# Altium schematic symbol library Diodes - TVS.SchLib: 5379 symbols (part 10 of 35) (continued)
## PESD5V0S1BB,335 (continued)
TVS DIODE 5V 14V SOD523; Manufacturer: Nexperia USA Inc.; Bidirectional Channels: 1; Capacitance @ Frequency: 35pF @ 1MHz; Current - Peak Pulse (10/1000µs): 12A (8/20µs); Power Line Protection: No; Power - Peak Pulse: 130W; Type: Zener; Voltage - Breakdown (Min): 5.5V; Voltage - Reverse Standoff (Typ): 5V (Max); Part Number: PESD5V0S1BB,335; Applications: General Purpose; ComponentLink1Description: Datasheet; ComponentLink1URL: https://assets.nexperia.com/documents/data-sheet/PESD5V0S1BA_BB_BL.pdf; ComponentLink2Description: DigiKey Link; ComponentLink2URL: http://digikey.com/product-detail/en/nexperia-usa-inc/PESD5V0S1BB335/1727-5799-1-ND/2698191; LastUpdated: 9/2/2020 1:28:25 AM; Lifecycle Status: Active; Minimum Order: 1; Mounting Type: Surface Mount; Operating Temperature: -65°C ~ 150°C (TA); Package / Case: SC-79, SOD-523; Packaging: TapeAndReel; PartId: 9821; Part Status: Active; Price: 0.05; Series: -; Supplier 1: DigiKey; Supplier Part Number 1: 1727-5799-1-ND; Supplier Device Package: SOD-523; Voltage - Clamping (Max) @ Ipp: 14V
footprint SOD523F
pins: 1, 2

## PESD5V0S1UA,115
designator D?
TVS DIODE 5V 19V SOD323; Manufacturer: Nexperia USA Inc.; Capacitance @ Frequency: 480pF @ 1MHz; Current - Peak Pulse (10/1000µs): 47A (8/20µs); Power Line Protection: No; Power - Peak Pulse: 890W; Type: Zener; Unidirectional Channels: 1; Voltage - Breakdown (Min): 6.2V; Voltage - Reverse Standoff (Typ): 5V (Max); Part Number: PESD5V0S1UA,115; Applications: Automotive; ComponentLink1Description: Datasheet; ComponentLink1URL: https://assets.nexperia.com/documents/data-sheet/PESD5V0S1UA_PESD12VS1UA.pdf; ComponentLink2Description: DigiKey Link; ComponentLink2URL: http://digikey.com/product-detail/en/nexperia-usa-inc/PESD5V0S1UA115/1727-5801-1-ND/2697465; LastUpdated: 9/2/2020 1:28:27 AM; Lifecycle Status: Active; Minimum Order: 1; Mounting Type: Surface Mount; Operating Temperature: -55°C ~ 150°C (TA); Package / Case: SC-76, SOD-323; Packaging: TapeAndReel; PartId: 9878; Part Status: Active; Price: 0.08; Series: Automotive, AEC-Q101; Supplier 1: DigiKey; Supplier Part Number 1: 1727-5801-1-ND; Supplier Device Package: SOD-323; Voltage - Clamping (Max) @ Ipp: 19V
footprint SOD323
pins: 1, 2

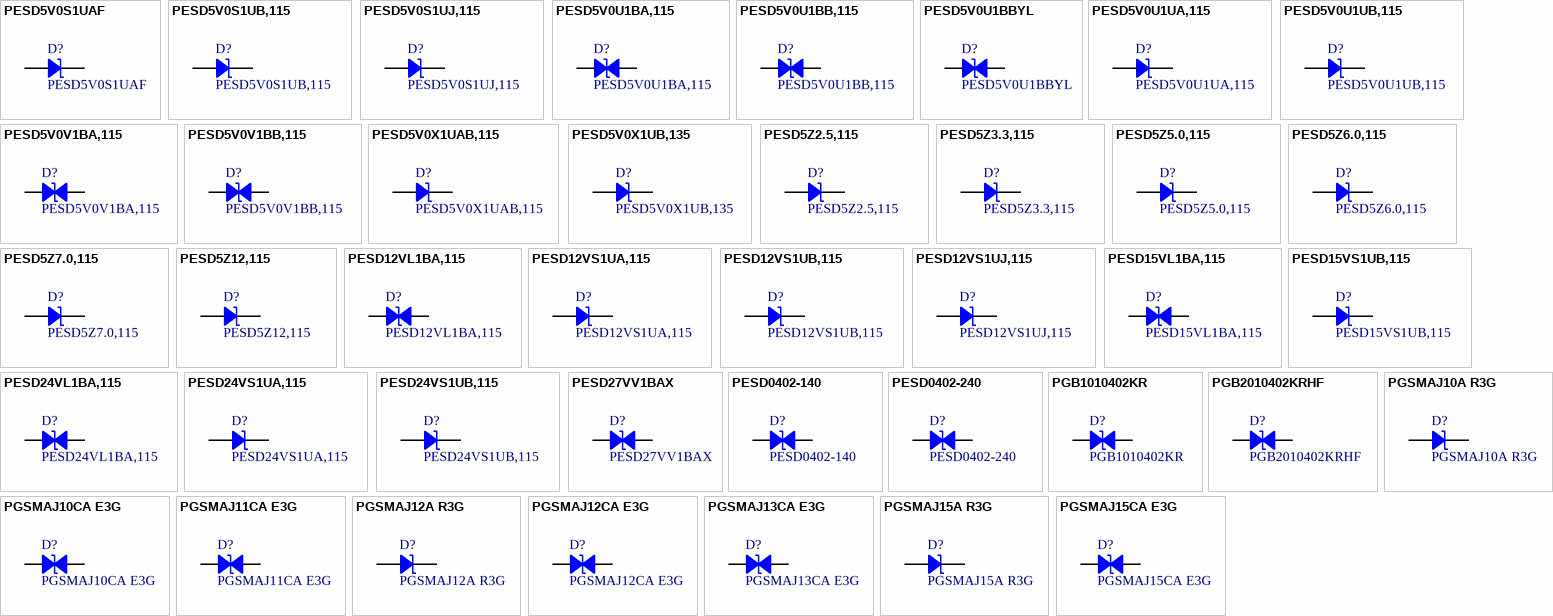
[diagram p35: symbols PESD5V0S1UAF to PGSMAJ15CA E3G]

## PESD5V0S1UAF
designator D?
TVS DIODE 5V 19V SOD323; Manufacturer: Nexperia USA Inc.; Capacitance @ Frequency: 480pF @ 1MHz; Current - Peak Pulse (10/1000µs): 47A (8/20µs); Power Line Protection: No; Power - Peak Pulse: 890W; Type: Zener; Unidirectional Channels: 1; Voltage - Breakdown (Min): 6.2V; Voltage - Reverse Standoff (Typ): 5V (Max); Part Number: PESD5V0S1UAF; Applications: Automotive; ComponentLink1Description: Datasheet; ComponentLink1URL: https://assets.nexperia.com/documents/data-sheet/PESD5V0S1UA_PESD12VS1UA.pdf; ComponentLink2Description: DigiKey Link; ComponentLink2URL: http://digikey.com/product-detail/en/nexperia-usa-inc/PESD5V0S1UAF/1727-2750-1-ND/6576215; LastUpdated: 9/2/2020 1:28:27 AM; Lifecycle Status: Active; Minimum Order: 1; Mounting Type: Surface Mount; Operating Temperature: -55°C ~ 150°C (TA); Package / Case: SC-76, SOD-323; Packaging: TapeAndReel; PartId: 9871; Part Status: Active; Price: 0.06; Series: Automotive, AEC-Q101; Supplier 1: DigiKey; Supplier Part Number 1: 1727-2750-1-ND; Supplier Device Package: SOD-323; Voltage - Clamping (Max) @ Ipp: 19V
footprint SOD323
pins: 1, 2

## PESD5V0S1UB,115
designator D?
TVS DIODE 5V 20V SOD523; Manufacturer: Nexperia USA Inc.; Capacitance @ Frequency: 152pF @ 1MHz; Current - Peak Pulse (10/1000µs): 15A (8/20µs); Power Line Protection: No; Power - Peak Pulse: 260W; Type: Zener; Unidirectional Channels: 1; Voltage - Breakdown (Min): 6.4V; Voltage - Reverse Standoff (Typ): 5V (Max); Part Number: PESD5V0S1UB,115; Applications: General Purpose; ComponentLink1Description: Datasheet; ComponentLink1URL: https://assets.nexperia.com/documents/data-sheet/PESDXS1UB_SERIES.pdf; ComponentLink2Description: DigiKey Link; ComponentLink2URL: http://digikey.com/product-detail/en/nexperia-usa-inc/PESD5V0S1UB115/1727-3839-1-ND/1530845; LastUpdated: 9/2/2020 1:28:24 AM; Lifecycle Status: Active; Minimum Order: 1; Mounting Type: Surface Mount; Operating Temperature: -65°C ~ 150°C (TA); Package / Case: SC-79, SOD-523; Packaging: TapeAndReel; PartId: 9746; Part Status: Active; Price: 0.09; Series: -; Supplier 1: DigiKey; Supplier Part Number 1: 1727-3839-1-ND; Supplier Device Package: SOD-523; Voltage - Clamping (Max) @ Ipp: 20V
footprint SOD523F
pins: 1, 2

## PESD5V0S1UJ,115
designator D?
TVS DIODE 5V 19V SOD323F; Manufacturer: Nexperia USA Inc.; Capacitance @ Frequency: 480pF @ 1MHz; Current - Peak Pulse (10/1000µs): 47A (8/20µs); Power Line Protection: No; Power - Peak Pulse: 890W; Type: Zener; Unidirectional Channels: 1; Voltage - Breakdown (Min): 6.2V; Voltage - Reverse Standoff (Typ): 5V (Max); Part Number: PESD5V0S1UJ,115; Applications: Automotive; ComponentLink1Description: Datasheet; ComponentLink1URL: https://assets.nexperia.com/documents/data-sheet/PESD5V0S1UJ_PESD12VS1UJ.pdf; ComponentLink2Description: DigiKey Link; ComponentLink2URL: http://digikey.com/product-detail/en/nexperia-usa-inc/PESD5V0S1UJ115/1727-5802-1-ND/2697512; LastUpdated: 9/2/2020 1:28:42 AM; Lifecycle Status: Active; Minimum Order: 1; Mounting Type: Surface Mount; Operating Temperature: -55°C ~ 150°C (TA); Package / Case: SC-90, SOD-323F; Packaging: TapeAndReel; PartId: 10357; Part Status: Active; Price: 0.08; Series: Automotive, AEC-Q101; Supplier 1: DigiKey; Supplier Part Number 1: 1727-5802-1-ND; Supplier Device Package: SOD-323F; Voltage - Clamping (Max) @ Ipp: 19V
footprint SOD323F
pins: 1, 2

## PESD5V0U1BA,115
designator D?
TVS DIODE 5V SOD323; Manufacturer: Nexperia USA Inc.; Bidirectional Channels: 1; Capacitance @ Frequency: 2.9pF @ 1MHz; Power Line Protection: No; Type: Zener; Voltage - Breakdown (Min): 5.5V; Voltage - Reverse Standoff (Typ): 5V (Max); Part Number: PESD5V0U1BA,115; Applications: General Purpose; ComponentLink1Description: Datasheet; ComponentLink1URL: https://assets.nexperia.com/documents/data-sheet/PESD5V0U1BA_BB_BL.pdf; ComponentLink2Description: DigiKey Link; ComponentLink2URL: http://digikey.com/product-detail/en/nexperia-usa-inc/PESD5V0U1BA115/1727-3934-1-ND/1692988; LastUpdated: 9/2/2020 1:28:29 AM; Lifecycle Status: Active; Minimum Order: 1; Mounting Type: Surface Mount; Operating Temperature: -65°C ~ 150°C (TA); Package / Case: SC-76, SOD-323; Packaging: TapeAndReel; PartId: 9937; Part Status: Active; Price: 0.09; Series: -; Supplier 1: DigiKey; Supplier Part Number 1: 1727-3934-1-ND; Supplier Device Package: SOD-323
footprint SOD323
pins: 1, 2

## PESD5V0U1BB,115
designator D?
TVS DIODE 5V SOD523; Manufacturer: Nexperia USA Inc.; Bidirectional Channels: 1; Capacitance @ Frequency: 2.9pF @ 1MHz; Power Line Protection: No; Type: Zener; Voltage - Breakdown (Min): 5.5V; Voltage - Reverse Standoff (Typ): 5V (Max); Part Number: PESD5V0U1BB,115; Applications: General Purpose; ComponentLink1Description: Datasheet; ComponentLink1URL: https://assets.nexperia.com/documents/data-sheet/PESD5V0U1BA_BB_BL.pdf; ComponentLink2Description: DigiKey Link; ComponentLink2URL: http://digikey.com/product-detail/en/nexperia-usa-inc/PESD5V0U1BB115/1727-3935-1-ND/1692989; LastUpdated: 9/2/2020 1:28:25 AM; Lifecycle Status: Active; Minimum Order: 1; Mounting Type: Surface Mount; Operating Temperature: -65°C ~ 150°C (TA); Package / Case: SC-79, SOD-523; Packaging: TapeAndReel; PartId: 9829; Part Status: Active; Price: 0.15; Series: -; Supplier 1: DigiKey; Supplier Part Number 1: 1727-3935-1-ND; Supplier Device Package: SOD-523
footprint SOD523F
pins: 1, 2

## PESD5V0U1BBYL
designator D?
TVS DIODE 5V SOD523; Manufacturer: Nexperia USA Inc.; Bidirectional Channels: 1; Capacitance @ Frequency: 2.9pF @ 1MHz; Power Line Protection: No; Type: Zener; Voltage - Breakdown (Min): 5.5V; Voltage - Reverse Standoff (Typ): 5V (Max); Part Number: PESD5V0U1BBYL; Applications: General Purpose; ComponentLink1Description: Datasheet; ComponentLink1URL: https://assets.nexperia.com/documents/data-sheet/PESD5V0U1BA_BB_BL.pdf; ComponentLink2Description: DigiKey Link; ComponentLink2URL: http://digikey.com/product-detail/en/nexperia-usa-inc/PESD5V0U1BBYL/1727-8532-1-ND/10061269; LastUpdated: 9/2/2020 1:28:25 AM; Lifecycle Status: Active; Minimum Order: 1; Mounting Type: Surface Mount; Operating Temperature: 150°C (TJ); Package / Case: SC-79, SOD-523; Packaging: TapeAndReel; PartId: 9817; Part Status: Active; Price: 0.08; Series: -; Supplier 1: DigiKey; Supplier Part Number 1: 1727-8532-1-ND; Supplier Device Package: SOD-523
footprint SOD523F
pins: 1, 2

## PESD5V0U1UA,115
designator D?
TVS DIODE 5V SOD323; Manufacturer: Nexperia USA Inc.; Capacitance @ Frequency: 2pF @ 1MHz; Power Line Protection: No; Type: Zener; Unidirectional Channels: 1; Voltage - Breakdown (Min): 5.8V; Voltage - Reverse Standoff (Typ): 5V (Max); Part Number: PESD5V0U1UA,115; Applications: Automotive; ComponentLink1Description: Datasheet; ComponentLink1URL: https://assets.nexperia.com/documents/data-sheet/PESD5V0U1UA_UB_UL.pdf; ComponentLink2Description: DigiKey Link; ComponentLink2URL: http://digikey.com/product-detail/en/nexperia-usa-inc/PESD5V0U1UA115/1727-4155-1-ND/1993007; LastUpdated: 9/2/2020 1:28:27 AM; Lifecycle Status: Active; Minimum Order: 1; Mounting Type: Surface Mount; Operating Temperature: -55°C ~ 150°C (TA); Package / Case: SC-76, SOD-323; Packaging: TapeAndReel; PartId: 9900; Part Status: Active; Price: 0.08; Series: Automotive, AEC-Q101; Supplier 1: DigiKey; Supplier Part Number 1: 1727-4155-1-ND; Supplier Device Package: SOD-323
footprint SOD323
pins: 1, 2

## PESD5V0U1UB,115
designator D?
TVS DIODE 5V SOD523; Manufacturer: Nexperia USA Inc.; Capacitance @ Frequency: 2pF @ 1MHz; Power Line Protection: No; Type: Zener; Unidirectional Channels: 1; Voltage - Breakdown (Min): 5.8V; Voltage - Reverse Standoff (Typ): 5V (Max); Part Number: PESD5V0U1UB,115; Applications: Automotive; ComponentLink1Description: Datasheet; ComponentLink1URL: https://assets.nexperia.com/documents/data-sheet/PESD5V0U1UA_UB_UL.pdf; ComponentLink2Description: DigiKey Link; ComponentLink2URL: http://digikey.com/product-detail/en/nexperia-usa-inc/PESD5V0U1UB115/1727-4156-1-ND/1993008; LastUpdated: 9/2/2020 1:28:24 AM; Lifecycle Status: Active; Minimum Order: 1; Mounting Type: Surface Mount; Operating Temperature: -55°C ~ 150°C (TA); Package / Case: SC-79, SOD-523; Packaging: TapeAndReel; PartId: 9772; Part Status: Active; Price: 0.08; Series: Automotive, AEC-Q101; Supplier 1: DigiKey; Supplier Part Number 1: 1727-4156-1-ND; Supplier Device Package: SOD-523
footprint SOD523F
pins: 1, 2

## PESD5V0V1BA,115
designator D?
TVS DIODE 5V 12.5V SOD323; Manufacturer: Nexperia USA Inc.; Bidirectional Channels: 1; Capacitance @ Frequency: 11pF @ 1MHz; Current - Peak Pulse (10/1000µs): 4.8A (8/20µs); Power Line Protection: No; Power - Peak Pulse: 45W; Type: Zener; Voltage - Breakdown (Min): 5.8V; Voltage - Reverse Standoff (Typ): 5V (Max); Part Number: PESD5V0V1BA,115; Applications: Automotive; ComponentLink1Description: Datasheet; ComponentLink1URL: https://assets.nexperia.com/documents/data-sheet/PESD5V0V1BA_BB_BL.pdf; ComponentLink2Description: DigiKey Link; ComponentLink2URL: http://digikey.com/product-detail/en/nexperia-usa-inc/PESD5V0V1BA115/1727-5807-1-ND/2697413; LastUpdated: 9/2/2020 1:28:29 AM; Lifecycle Status: Active; Minimum Order: 1; Mounting Type: Surface Mount; Operating Temperature: -55°C ~ 150°C (TA); Package / Case: SC-76, SOD-323; Packaging: TapeAndReel; PartId: 9963; Part Status: Active; Price: 0.07; Series: Automotive, AEC-Q101; Supplier 1: DigiKey; Supplier Part Number 1: 1727-5807-1-ND; Supplier Device Package: SOD-323; Voltage - Clamping (Max) @ Ipp: 12.5V
footprint SOD323
pins: 1, 2

## PESD5V0V1BB,115
designator D?
TVS DIODE 5V 12.5V SOD523; Manufacturer: Nexperia USA Inc.; Bidirectional Channels: 1; Capacitance @ Frequency: 11pF @ 1MHz; Current - Peak Pulse (10/1000µs): 4.8A (8/20µs); Power Line Protection: No; Power - Peak Pulse: 45W; Type: Zener; Voltage - Breakdown (Min): 5.8V; Voltage - Reverse Standoff (Typ): 5V (Max); Part Number: PESD5V0V1BB,115; Applications: Automotive; ComponentLink1Description: Datasheet; ComponentLink1URL: https://assets.nexperia.com/documents/data-sheet/PESD5V0V1BA_BB_BL.pdf; ComponentLink2Description: DigiKey Link; ComponentLink2URL: http://digikey.com/product-detail/en/nexperia-usa-inc/PESD5V0V1BB115/1727-5808-1-ND/2697421; LastUpdated: 9/2/2020 1:28:25 AM; Lifecycle Status: Active; Minimum Order: 1; Mounting Type: Surface Mount; Operating Temperature: -55°C ~ 150°C (TA); Package / Case: SC-79, SOD-523; Packaging: TapeAndReel; PartId: 9831; Part Status: Active; Price: 0.12; Series: Automotive, AEC-Q101; Supplier 1: DigiKey; Supplier Part Number 1: 1727-5808-1-ND; Supplier Device Package: SOD-523; Voltage - Clamping (Max) @ Ipp: 12.5V
footprint SOD523F
pins: 1, 2

## PESD5V0X1UAB,115
designator D?
TVS DIODE 5V 9V SOD523; Manufacturer: Nexperia USA Inc.; Capacitance @ Frequency: 1.55pF @ 1MHz; Current - Peak Pulse (10/1000µs): 2A (8/20µs); Power Line Protection: No; Type: Zener; Unidirectional Channels: 1; Voltage - Breakdown (Min): 5.8V; Voltage - Clamping (Max) @ Ipp: 9V (Typ); Voltage - Reverse Standoff (Typ): 5V (Max); Part Number: PESD5V0X1UAB,115; Applications: Automotive; ComponentLink1Description: Datasheet; ComponentLink1URL: https://assets.nexperia.com/documents/data-sheet/PESD5V0X1UAB.pdf; ComponentLink2Description: DigiKey Link; ComponentLink2URL: http://digikey.com/product-detail/en/nexperia-usa-inc/PESD5V0X1UAB115/1727-1324-1-ND/4386336; LastUpdated: 9/2/2020 1:28:24 AM; Lifecycle Status: Active; Minimum Order: 1; Mounting Type: Surface Mount; Operating Temperature: -55°C ~ 150°C (TA); Package / Case: SC-79, SOD-523; Packaging: TapeAndReel; PartId: 9785; Part Status: Active; Price: 0.10; Series: Automotive, AEC-Q101; Supplier 1: DigiKey; Supplier Part Number 1: 1727-1324-1-ND; Supplier Device Package: SOD-523
footprint SOD523F
pins: 1, 2

## PESD5V0X1UB,135
designator D?
TVS DIODE 5V 8V SOD523; Manufacturer: Nexperia USA Inc.; Capacitance @ Frequency: 0.95pF @ 1MHz; Current - Peak Pulse (10/1000µs): 1.5A (8/20µs); Power Line Protection: No; Type: Zener; Unidirectional Channels: 1; Voltage - Breakdown (Min): 5.8V; Voltage - Clamping (Max) @ Ipp: 8V (Typ); Voltage - Reverse Standoff (Typ): 5V (Max); Part Number: PESD5V0X1UB,135; Applications: Automotive; ComponentLink1Description: Datasheet; ComponentLink1URL: https://assets.nexperia.com/documents/data-sheet/PESD5V0X1UB.pdf; ComponentLink2Description: DigiKey Link; ComponentLink2URL: http://digikey.com/product-detail/en/nexperia-usa-inc/PESD5V0X1UB135/1727-5906-1-ND/2744560; LastUpdated: 9/2/2020 1:28:24 AM; Lifecycle Status: Active; Minimum Order: 1; Mounting Type: Surface Mount; Operating Temperature: -55°C ~ 150°C (TA); Package / Case: SC-79, SOD-523; Packaging: TapeAndReel; PartId: 9811; Part Status: Active; Price: 0.08; Series: Automotive, AEC-Q101; Supplier 1: DigiKey; Supplier Part Number 1: 1727-5906-1-ND; Supplier Device Package: SOD-523
footprint SOD523F
pins: 1, 2

## PESD5Z2.5,115
designator D?
TVS DIODE 2.5V 15V SOD523; Manufacturer: Nexperia USA Inc.; Capacitance @ Frequency: 229pF @ 1MHz; Current - Peak Pulse (10/1000µs): 20A (8/20µs); Power Line Protection: No; Power - Peak Pulse: 260W; Type: Zener; Unidirectional Channels: 1; Voltage - Breakdown (Min): 4V; Voltage - Reverse Standoff (Typ): 2.5V (Max); Part Number: PESD5Z2.5,115; Applications: Ethernet; ComponentLink1Description: Datasheet; ComponentLink1URL: https://assets.nexperia.com/documents/data-sheet/PESD5ZX_SER.pdf; ComponentLink2Description: DigiKey Link; ComponentLink2URL: http://digikey.com/product-detail/en/nexperia-usa-inc/PESD5Z2.5115/1727-5813-1-ND/2697433; LastUpdated: 9/2/2020 1:28:24 AM; Lifecycle Status: Active; Minimum Order: 1; Mounting Type: Surface Mount; Operating Temperature: -65°C ~ 150°C (TA); Package / Case: SC-79, SOD-523; Packaging: TapeAndReel; PartId: 9802; Part Status: Active; Price: 0.05; Series: -; Supplier 1: DigiKey; Supplier Part Number 1: 1727-5813-1-ND; Supplier Device Package: SOD-523; Voltage - Clamping (Max) @ Ipp: 15V
footprint SOD523F
pins: 1, 2

## PESD5Z3.3,115
designator D?
TVS DIODE 3.3V 18V SOD523; Manufacturer: Nexperia USA Inc.; Capacitance @ Frequency: 172pF @ 1MHz; Current - Peak Pulse (10/1000µs): 20A (8/20µs); Power Line Protection: No; Power - Peak Pulse: 260W; Type: Zener; Unidirectional Channels: 1; Voltage - Breakdown (Min): 5V; Voltage - Reverse Standoff (Typ): 3.3V (Max); Part Number: PESD5Z3.3,115; Applications: Ethernet; ComponentLink1Description: Datasheet; ComponentLink1URL: https://assets.nexperia.com/documents/data-sheet/PESD5ZX_SER.pdf; ComponentLink2Description: DigiKey Link; ComponentLink2URL: http://digikey.com/product-detail/en/nexperia-usa-inc/PESD5Z3.3115/1727-5814-1-ND/2697434; LastUpdated: 9/2/2020 1:28:24 AM; Lifecycle Status: Active; Minimum Order: 1; Mounting Type: Surface Mount; Operating Temperature: -65°C ~ 150°C (TA); Package / Case: SC-79, SOD-523; Packaging: TapeAndReel; PartId: 9750; Part Status: Active; Price: 0.05; Series: -; Supplier 1: DigiKey; Supplier Part Number 1: 1727-5814-1-ND; Supplier Device Package: SOD-523; Voltage - Clamping (Max) @ Ipp: 18V
footprint SOD523F
pins: 1, 2

## PESD5Z5.0,115
designator D?
TVS DIODE 5V 18V SOD523; Manufacturer: Nexperia USA Inc.; Capacitance @ Frequency: 89pF @ 1MHz; Current - Peak Pulse (10/1000µs): 10A (8/20µs); Power Line Protection: No; Power - Peak Pulse: 180W; Type: Zener; Unidirectional Channels: 1; Voltage - Breakdown (Min): 6.2V; Voltage - Reverse Standoff (Typ): 5V (Max); Part Number: PESD5Z5.0,115; Applications: Ethernet; ComponentLink1Description: Datasheet; ComponentLink1URL: https://assets.nexperia.com/documents/data-sheet/PESD5ZX_SER.pdf; ComponentLink2Description: DigiKey Link; ComponentLink2URL: http://digikey.com/product-detail/en/nexperia-usa-inc/PESD5Z5.0115/1727-5165-1-ND/2531754; LastUpdated: 9/2/2020 1:28:24 AM; Lifecycle Status: Active; Minimum Order: 1; Mounting Type: Surface Mount; Operating Temperature: -65°C ~ 150°C (TA); Package / Case: SC-79, SOD-523; Packaging: TapeAndReel; PartId: 9753; Part Status: Active; Price: 0.05; Series: -; Supplier 1: DigiKey; Supplier Part Number 1: 1727-5165-1-ND; Supplier Device Package: SOD-523; Voltage - Clamping (Max) @ Ipp: 18V
footprint SOD523F
pins: 1, 2

## PESD5Z6.0,115
designator D?
TVS DIODE 6V 18V SOD523; Manufacturer: Nexperia USA Inc.; Capacitance @ Frequency: 78pF @ 1MHz; Current - Peak Pulse (10/1000µs): 10A (8/20µs); Power Line Protection: No; Power - Peak Pulse: 180W; Type: Zener; Unidirectional Channels: 1; Voltage - Breakdown (Min): 6.8V; Voltage - Reverse Standoff (Typ): 6V (Max); Part Number: PESD5Z6.0,115; Applications: Ethernet; ComponentLink1Description: Datasheet; ComponentLink1URL: https://assets.nexperia.com/documents/data-sheet/PESD5ZX_SER.pdf; ComponentLink2Description: DigiKey Link; ComponentLink2URL: http://digikey.com/product-detail/en/nexperia-usa-inc/PESD5Z6.0115/1727-5815-1-ND/2697424; LastUpdated: 9/2/2020 1:28:24 AM; Lifecycle Status: Active; Minimum Order: 1; Mounting Type: Surface Mount; Operating Temperature: -65°C ~ 150°C (TA); Package / Case: SC-79, SOD-523; Packaging: TapeAndReel; PartId: 9779; Part Status: Active; Price: 0.05; Series: -; Supplier 1: DigiKey; Supplier Part Number 1: 1727-5815-1-ND; Supplier Device Package: SOD-523; Voltage - Clamping (Max) @ Ipp: 18V
footprint SOD523F
pins: 1, 2

## PESD5Z7.0,115
designator D?
TVS DIODE 7V 19V SOD523; Manufacturer: Nexperia USA Inc.; Capacitance @ Frequency: 69pF @ 1MHz; Current - Peak Pulse (10/1000µs): 10A (8/20µs); Power Line Protection: No; Power - Peak Pulse: 180W; Type: Zener; Unidirectional Channels: 1; Voltage - Breakdown (Min): 7.5V; Voltage - Reverse Standoff (Typ): 7V (Max); Part Number: PESD5Z7.0,115; Applications: Ethernet; ComponentLink1Description: Datasheet; ComponentLink1URL: https://assets.nexperia.com/documents/data-sheet/PESD5ZX_SER.pdf; ComponentLink2Description: DigiKey Link; ComponentLink2URL: http://digikey.com/product-detail/en/nexperia-usa-inc/PESD5Z7.0115/1727-5416-1-ND/2676902; LastUpdated: 9/2/2020 1:28:24 AM; Lifecycle Status: Active; Minimum Order: 1; Mounting Type: Surface Mount; Operating Temperature: -65°C ~ 150°C (TA); Package / Case: SC-79, SOD-523; Packaging: TapeAndReel; PartId: 9803; Part Status: Active; Price: 0.05; Series: -; Supplier 1: DigiKey; Supplier Part Number 1: 1727-5416-1-ND; Supplier Device Package: SOD-523; Voltage - Clamping (Max) @ Ipp: 19V
footprint SOD523F
pins: 1, 2

## PESD5Z12,115
designator D?
TVS DIODE 12V 35V SOD523; Manufacturer: Nexperia USA Inc.; Capacitance @ Frequency: 35pF @ 1MHz; Current - Peak Pulse (10/1000µs): 6A (8/20µs); Power Line Protection: No; Power - Peak Pulse: 200W; Type: Zener; Unidirectional Channels: 1; Voltage - Breakdown (Min): 14.1V; Voltage - Reverse Standoff (Typ): 12V (Max); Part Number: PESD5Z12,115; Applications: Ethernet; ComponentLink1Description: Datasheet; ComponentLink1URL: https://assets.nexperia.com/documents/data-sheet/PESD5ZX_SER.pdf; ComponentLink2Description: DigiKey Link; ComponentLink2URL: http://digikey.com/product-detail/en/nexperia-usa-inc/PESD5Z12115/1727-5812-1-ND/2697432; LastUpdated: 9/2/2020 1:28:24 AM; Lifecycle Status: Active; Minimum Order: 1; Mounting Type: Surface Mount; Operating Temperature: -65°C ~ 150°C (TA); Package / Case: SC-79, SOD-523; Packaging: TapeAndReel; PartId: 9778; Part Status: Active; Price: 0.05; Series: -; Supplier 1: DigiKey; Supplier Part Number 1: 1727-5812-1-ND; Supplier Device Package: SOD-523; Voltage - Clamping (Max) @ Ipp: 35V
footprint SOD523F
pins: 1, 2

## PESD12VL1BA,115
designator D?
TVS DIODE 12V 37V SOD323; Manufacturer: Nexperia USA Inc.; Bidirectional Channels: 1; Capacitance @ Frequency: 19pF @ 1MHz; Current - Peak Pulse (10/1000µs): 5A (8/20µs); Power Line Protection: No; Power - Peak Pulse: 200W; Type: Zener; Voltage - Breakdown (Min): 14.2V; Voltage - Reverse Standoff (Typ): 12V (Max); Part Number: PESD12VL1BA,115; Applications: General Purpose; ComponentLink1Description: Datasheet; ComponentLink1URL: https://assets.nexperia.com/documents/data-sheet/PESDXL1BA_SER.pdf; ComponentLink2Description: DigiKey Link; ComponentLink2URL: http://digikey.com/product-detail/en/nexperia-usa-inc/PESD12VL1BA115/1727-3808-1-ND/1530812; LastUpdated: 9/2/2020 1:28:29 AM; Lifecycle Status: Active; Minimum Order: 1; Mounting Type: Surface Mount; Operating Temperature: -65°C ~ 150°C (TA); Package / Case: SC-76, SOD-323; Packaging: TapeAndReel; PartId: 9969; Part Status: Active; Price: 0.11; Series: -; Supplier 1: DigiKey; Supplier Part Number 1: 1727-3808-1-ND; Supplier Device Package: SOD-323; Voltage - Clamping (Max) @ Ipp: 37V
footprint SOD323
pins: 1, 2

## PESD12VS1UA,115
designator D?
TVS DIODE 12V 27V SOD323; Manufacturer: Nexperia USA Inc.; Capacitance @ Frequency: 160pF @ 1MHz; Current - Peak Pulse (10/1000µs): 22.5A (8/20µs); Power Line Protection: No; Power - Peak Pulse: 600W; Type: Zener; Unidirectional Channels: 1; Voltage - Breakdown (Min): 13.3V; Voltage - Reverse Standoff (Typ): 12V (Max); Part Number: PESD12VS1UA,115; Applications: Automotive; ComponentLink1Description: Datasheet; ComponentLink1URL: https://assets.nexperia.com/documents/data-sheet/PESD5V0S1UA_PESD12VS1UA.pdf; ComponentLink2Description: DigiKey Link; ComponentLink2URL: http://digikey.com/product-detail/en/nexperia-usa-inc/PESD12VS1UA115/1727-5160-1-ND/2531746; LastUpdated: 9/2/2020 1:28:27 AM; Lifecycle Status: Active; Minimum Order: 1; Mounting Type: Surface Mount; Operating Temperature: -55°C ~ 150°C (TA); Package / Case: SC-76, SOD-323; Packaging: TapeAndReel; PartId: 9904; Part Status: Active; Price: 0.08; Series: Automotive, AEC-Q101; Supplier 1: DigiKey; Supplier Part Number 1: 1727-5160-1-ND; Supplier Device Package: SOD-323; Voltage - Clamping (Max) @ Ipp: 27V
footprint SOD323
pins: 1, 2

## PESD12VS1UB,115
designator D?
TVS DIODE 12V 35V SOD523; Manufacturer: Nexperia USA Inc.; Capacitance @ Frequency: 38pF @ 1MHz; Current - Peak Pulse (10/1000µs): 5A (8/20µs); Power Line Protection: No; Power - Peak Pulse: 180W; Type: Zener; Unidirectional Channels: 1; Voltage - Breakdown (Min): 14.7V; Voltage - Reverse Standoff (Typ): 12V (Max); Part Number: PESD12VS1UB,115; Applications: General Purpose; ComponentLink1Description: Datasheet; ComponentLink1URL: https://assets.nexperia.com/documents/data-sheet/PESDXS1UB_SERIES.pdf; ComponentLink2Description: DigiKey Link; ComponentLink2URL: http://digikey.com/product-detail/en/nexperia-usa-inc/PESD12VS1UB115/1727-5161-1-ND/2531747; LastUpdated: 9/2/2020 1:28:24 AM; Lifecycle Status: Active; Minimum Order: 1; Mounting Type: Surface Mount; Operating Temperature: -65°C ~ 150°C (TA); Package / Case: SC-79, SOD-523; Packaging: TapeAndReel; PartId: 9766; Part Status: Active; Price: 0.09; Series: -; Supplier 1: DigiKey; Supplier Part Number 1: 1727-5161-1-ND; Supplier Device Package: SOD-523; Voltage - Clamping (Max) @ Ipp: 35V
footprint SOD523F
pins: 1, 2

## PESD12VS1UJ,115
designator D?
TVS DIODE 12V 27V SOD323F; Manufacturer: Nexperia USA Inc.; Capacitance @ Frequency: 160pF @ 1MHz; Current - Peak Pulse (10/1000µs): 22.5A (8/20µs); Power Line Protection: No; Power - Peak Pulse: 600W; Type: Zener; Unidirectional Channels: 1; Voltage - Breakdown (Min): 13.3V; Voltage - Reverse Standoff (Typ): 12V (Max); Part Number: PESD12VS1UJ,115; Applications: Automotive; ComponentLink1Description: Datasheet; ComponentLink1URL: https://assets.nexperia.com/documents/data-sheet/PESD5V0S1UJ_PESD12VS1UJ.pdf; ComponentLink2Description: DigiKey Link; ComponentLink2URL: http://digikey.com/product-detail/en/nexperia-usa-inc/PESD12VS1UJ115/1727-5783-1-ND/2697480; LastUpdated: 9/2/2020 1:28:42 AM; Lifecycle Status: Active; Minimum Order: 1; Mounting Type: Surface Mount; Operating Temperature: -55°C ~ 150°C (TA); Package / Case: SC-90, SOD-323F; Packaging: TapeAndReel; PartId: 10356; Part Status: Active; Price: 0.08; Series: Automotive, AEC-Q101; Supplier 1: DigiKey; Supplier Part Number 1: 1727-5783-1-ND; Supplier Device Package: SOD-323F; Voltage - Clamping (Max) @ Ipp: 27V
footprint SOD323F
pins: 1, 2

## PESD15VL1BA,115
designator D?
TVS DIODE 15V 44V SOD323; Manufacturer: Nexperia USA Inc.; Bidirectional Channels: 1; Capacitance @ Frequency: 16pF @ 1MHz; Current - Peak Pulse (10/1000µs): 5A (8/20µs); Power Line Protection: No; Power - Peak Pulse: 200W; Type: Zener; Voltage - Breakdown (Min): 17.1V; Voltage - Reverse Standoff (Typ): 15V (Max); Part Number: PESD15VL1BA,115; Applications: General Purpose; ComponentLink1Description: Datasheet; ComponentLink1URL: https://assets.nexperia.com/documents/data-sheet/PESDXL1BA_SER.pdf; ComponentLink2Description: DigiKey Link; ComponentLink2URL: http://digikey.com/product-detail/en/nexperia-usa-inc/PESD15VL1BA115/1727-3812-1-ND/1530817; LastUpdated: 9/2/2020 1:28:29 AM; Lifecycle Status: Active; Minimum Order: 1; Mounting Type: Surface Mount; Operating Temperature: -65°C ~ 150°C (TA); Package / Case: SC-76, SOD-323; Packaging: TapeAndReel; PartId: 9991; Part Status: Active; Price: 0.11; Series: -; Supplier 1: DigiKey; Supplier Part Number 1: 1727-3812-1-ND; Supplier Device Package: SOD-323; Voltage - Clamping (Max) @ Ipp: 44V
footprint SOD323
pins: 1, 2

## PESD15VS1UB,115
designator D?
TVS DIODE 15V 40V SOD523; Manufacturer: Nexperia USA Inc.; Capacitance @ Frequency: 32pF @ 1MHz; Current - Peak Pulse (10/1000µs): 5A (8/20µs); Power Line Protection: No; Power - Peak Pulse: 160W; Type: Zener; Unidirectional Channels: 1; Voltage - Breakdown (Min): 17.6V; Voltage - Reverse Standoff (Typ): 15V (Max); Part Number: PESD15VS1UB,115; Applications: General Purpose; ComponentLink1Description: Datasheet; ComponentLink1URL: https://assets.nexperia.com/documents/data-sheet/PESDXS1UB_SERIES.pdf; ComponentLink2Description: DigiKey Link; ComponentLink2URL: http://digikey.com/product-detail/en/nexperia-usa-inc/PESD15VS1UB115/1727-5370-1-ND/2676851; LastUpdated: 9/2/2020 1:28:24 AM; Lifecycle Status: Active; Minimum Order: 1; Mounting Type: Surface Mount; Operating Temperature: -65°C ~ 150°C (TA); Package / Case: SC-79, SOD-523; Packaging: TapeAndReel; PartId: 9769; Part Status: Active; Price: 0.09; Series: -; Supplier 1: DigiKey; Supplier Part Number 1: 1727-5370-1-ND; Supplier Device Package: SOD-523; Voltage - Clamping (Max) @ Ipp: 40V
footprint SOD523F
pins: 1, 2

## PESD24VL1BA,115
designator D?
TVS DIODE 24V 70V SOD323; Manufacturer: Nexperia USA Inc.; Bidirectional Channels: 1; Capacitance @ Frequency: 11pF @ 1MHz; Current - Peak Pulse (10/1000µs): 3A (8/20µs); Power Line Protection: No; Power - Peak Pulse: 200W; Type: Zener; Voltage - Breakdown (Min): 25.4V; Voltage - Reverse Standoff (Typ): 24V (Max); Part Number: PESD24VL1BA,115; Applications: General Purpose; ComponentLink1Description: Datasheet; ComponentLink1URL: https://assets.nexperia.com/documents/data-sheet/PESD24VL1BA.pdf; ComponentLink2Description: DigiKey Link; ComponentLink2URL: http://digikey.com/product-detail/en/nexperia-usa-inc/PESD24VL1BA115/1727-3819-1-ND/1530824; LastUpdated: 9/2/2020 1:28:29 AM; Lifecycle Status: Active; Minimum Order: 1; Mounting Type: Surface Mount; Operating Temperature: -65°C ~ 150°C (TA); Package / Case: SC-76, SOD-323; Packaging: TapeAndReel; PartId: 9993; Part Status: Active; Price: 0.11; Series: -; Supplier 1: DigiKey; Supplier Part Number 1: 1727-3819-1-ND; Supplier Device Package: SOD-323; Voltage - Clamping (Max) @ Ipp: 70V
footprint SOD323
pins: 1, 2

## PESD24VS1UA,115
designator D?
TVS DIODE 24V 70V SOD323; Manufacturer: Nexperia USA Inc.; Capacitance @ Frequency: 23pF @ 1MHz; Current - Peak Pulse (10/1000µs): 3A (8/20µs); Power Line Protection: No; Power - Peak Pulse: 160W; Type: Zener; Unidirectional Channels: 1; Voltage - Breakdown (Min): 26.5V; Voltage - Reverse Standoff (Typ): 24V (Max); Part Number: PESD24VS1UA,115; Applications: Automotive; ComponentLink1Description: Datasheet; ComponentLink1URL: https://assets.nexperia.com/documents/data-sheet/PESD24VS1UA.pdf; ComponentLink2Description: DigiKey Link; ComponentLink2URL: http://digikey.com/product-detail/en/nexperia-usa-inc/PESD24VS1UA115/1727-1151-1-ND/4162481; LastUpdated: 9/2/2020 1:28:27 AM; Lifecycle Status: Active; Minimum Order: 1; Mounting Type: Surface Mount; Operating Temperature: -65°C ~ 150°C (TA); Package / Case: SC-76, SOD-323; Packaging: TapeAndReel; PartId: 9876; Part Status: Active; Price: 0.09; Series: Automotive, AEC-Q101; Supplier 1: DigiKey; Supplier Part Number 1: 1727-1151-1-ND; Supplier Device Package: SOD-323; Voltage - Clamping (Max) @ Ipp: 70V
footprint SOD323
pins: 1, 2

## PESD24VS1UB,115
designator D?
TVS DIODE 24V 70V SOD523; Manufacturer: Nexperia USA Inc.; Capacitance @ Frequency: 23pF @ 1MHz; Current - Peak Pulse (10/1000µs): 3A (8/20µs); Power Line Protection: No; Power - Peak Pulse: 160W; Type: Zener; Unidirectional Channels: 1; Voltage - Breakdown (Min): 26.5V; Voltage - Reverse Standoff (Typ): 24V (Max); Part Number: PESD24VS1UB,115; Applications: General Purpose; ComponentLink1Description: Datasheet; ComponentLink1URL: https://assets.nexperia.com/documents/data-sheet/PESDXS1UB_SERIES.pdf; ComponentLink2Description: DigiKey Link; ComponentLink2URL: http://digikey.com/product-detail/en/nexperia-usa-inc/PESD24VS1UB115/1727-3821-1-ND/1530826; LastUpdated: 9/2/2020 1:28:24 AM; Lifecycle Status: Active; Minimum Order: 1; Mounting Type: Surface Mount; Operating Temperature: -65°C ~ 150°C (TA); Package / Case: SC-79, SOD-523; Packaging: TapeAndReel; PartId: 9767; Part Status: Active; Price: 0.09; Series: -; Supplier 1: DigiKey; Supplier Part Number 1: 1727-3821-1-ND; Supplier Device Package: SOD-523; Voltage - Clamping (Max) @ Ipp: 70V
footprint SOD523F
pins: 1, 2

## PESD27VV1BAX
designator D?
PESD27VV1BA/SOD323/SOD2; Manufacturer: Nexperia USA Inc.; Bidirectional Channels: 1; Capacitance @ Frequency: 14pF @ 1MHz; Current - Peak Pulse (10/1000µs): 3A (8/20µs); Power Line Protection: No; Type: Zener; Voltage - Breakdown (Min): 28V; Voltage - Clamping (Max) @ Ipp: 45V; Voltage - Reverse Standoff (Typ): 27V (Max); Part Number: PESD27VV1BAX; Applications: Automotive, Telecom; ComponentLink1Description: Datasheet; ComponentLink1URL: https://assets.nexperia.com/documents/data-sheet/PESD27VV1BA.pdf; ComponentLink2Description: DigiKey Link; ComponentLink2URL: http://digikey.com/product-detail/en/nexperia-usa-inc/PESD27VV1BAX/1727-8584-1-ND/10261010; LastUpdated: 9/2/2020 1:28:29 AM; Lifecycle Status: Active; Minimum Order: 1; Mounting Type: Surface Mount; Operating Temperature: -55°C ~ 150°C (TA); Package / Case: SC-76, SOD-323; Packaging: TapeAndReel; PartId: 9931; Part Status: Active; Price: 0.07; Series: Automotive, AEC-Q101; Supplier 1: DigiKey; Supplier Part Number 1: 1727-8584-1-ND; Supplier Device Package: SOD-323
footprint SOD323
pins: 1, 2

## PESD0402-140
designator D?
TVS DIODE 14V 40V 0402; Manufacturer: Littelfuse Inc.; Bidirectional Channels: 1; Power Line Protection: No; Type: Zener; Voltage - Reverse Standoff (Typ): 14V (Max); Part Number: PESD0402-140; Applications: Ethernet, HDMI; ComponentLink1Description: Datasheet; ComponentLink1URL: https://www.littelfuse.com/~/media/electronics/product_specifications/polymer_esd_suppressors/littelfuse_polymer_esd_suppressor_pesd0402_140_product_specification.pdf.pdf; ComponentLink2Description: DigiKey Link; ComponentLink2URL: http://digikey.com/product-detail/en/littelfuse-inc/PESD0402-140/PESD0402-140CT-ND/1968526; Device Package: 0402 (1005 Metric); LastUpdated: 9/2/2020 1:28:49 AM; Lifecycle Status: Active; Minimum Order: 1; Mounting Type: Surface Mount; Operating Temperature: -55°C ~ 125°C (TJ); Package / Case: 0402 (1005 Metric); Packaging: TapeAndReel; PartId: 10440; Part Status: Active; Price: 0.12; Series: -; Supplier 1: DigiKey; Supplier Part Number 1: PESD0402-140CT-ND; Supplier Device Package: 0402; Voltage - Clamping (Max) @ Ipp: 40V
footprint 0402
pins: 1, 2

## PESD0402-240
designator D?
Manufacturer: Littelfuse Inc.; Bidirectional Channels: 1; Capacitance @ Frequency: 0.25pF @ 1MHz; Type: Zener; Voltage - Clamping (Max) @ Ipp: 40V (Typ); Voltage - Reverse Standoff (Typ): 24V; Part Number: PESD0402-240; Applications: Ethernet, HDMI; ComponentLink1Description: Datasheet; ComponentLink1URL: https://www.littelfuse.com/~/media/electronics/product_specifications/polymer_esd_suppressors/littelfuse_polymer_esd_suppressor_pesd0402_240_product_specification.pdf.pdf; ComponentLink2Description: DigiKey Link; ComponentLink2URL: http://digikey.com/product-detail/en/littelfuse-inc/PESD0402-240/PESD0402-240CT-ND/10244012; Device Package: 0402 (1005 Metric); LastUpdated: 9/2/2020 1:28:49 AM; Lifecycle Status: Active; Minimum Order: 1; Mounting Type: Surface Mount; Operating Temperature: -55°C ~ 125°C; Package / Case: 0402 (1005 Metric); Packaging: TapeAndReel; PartId: 10441; Part Status: Active; Price: 0.12; Series: -; Supplier 1: DigiKey; Supplier Part Number 1: PESD0402-240CT-ND; Supplier Device Package: 0402
footprint 0402
pins: 1, 2

## PGB1010402KR
designator D?
TVS DIODE 12V 250V 0402; Manufacturer: Littelfuse Inc.; Bidirectional Channels: 1; Power Line Protection: No; Type: Zener; Voltage - Clamping (Max) @ Ipp: 250V (Typ); Part Number: PGB1010402KR; Applications: General Purpose; ComponentLink1Description: Datasheet; ComponentLink1URL: https://www.littelfuse.com/data/en/data_sheets/littelfuse_pulseguard-esd_pgb1.pdf; ComponentLink2Description: DigiKey Link; ComponentLink2URL: http://digikey.com/product-detail/en/littelfuse-inc/PGB1010402KR/F2862CT-ND/1775286; Device Package: 0402 (1005 Metric); LastUpdated: 9/2/2020 1:28:49 AM; Lifecycle Status: Active; Minimum Order: 1; Mounting Type: Surface Mount; Operating Temperature: -65°C ~ 125°C (TJ); Package / Case: 0402 (1005 Metric); Packaging: TapeAndReel; PartId: 10439; Part Status: Active; Price: 0.19; Series: PulseGuard® PGB; Supplier 1: DigiKey; Supplier Part Number 1: F2862CT-ND; Supplier Device Package: 0402; Voltage - Reverse Standoff (Typ): 12V
footprint 0402
pins: 1, 2

## PGB2010402KRHF
designator D?
TVS DIODE 12V 40V 0402; Manufacturer: Littelfuse Inc.; Bidirectional Channels: 1; Power Line Protection: No; Type: Zener; Voltage - Clamping (Max) @ Ipp: 40V (Typ); Voltage - Reverse Standoff (Typ): 12V (Max); Part Number: PGB2010402KRHF; Applications: General Purpose; ComponentLink1Description: Datasheet; ComponentLink1URL: https://www.littelfuse.com/data/en/data_sheets/littelfuse_pulseguard-esd_pgb2.pdf; ComponentLink2Description: DigiKey Link; ComponentLink2URL: http://digikey.com/product-detail/en/littelfuse-inc/PGB2010402KRHF/F3268CT-ND/2038153; Device Package: 0402 (1005 Metric); LastUpdated: 9/2/2020 1:28:48 AM; Lifecycle Status: Active; Minimum Order: 1; Mounting Type: Surface Mount; Operating Temperature: -65°C ~ 125°C (TJ); Package / Case: 0402 (1005 Metric); Packaging: TapeAndReel; PartId: 10437; Part Status: Active; Price: 0.31; Series: PulseGuard® PGB2; Supplier 1: DigiKey; Supplier Part Number 1: F3268CT-ND; Supplier Device Package: 0402
footprint 0402
pins: 1, 2

## PGSMAJ10A R3G
designator D?
DIODE, TVS, UNIDIRECTIONAL; Manufacturer: Taiwan Semiconductor Corporation; Current - Peak Pulse (10/1000µs): 23.5A; Power Line Protection: No; Power - Peak Pulse: 400W; Type: Zener; Unidirectional Channels: 1; Voltage - Breakdown (Min): 11.1V; Voltage - Clamping (Max) @ Ipp: 17V; Voltage - Reverse Standoff (Typ): 10V; Part Number: PGSMAJ10A R3G; Applications: Automotive; ComponentLink1Description: Datasheet; ComponentLink1URL: https://www.taiwansemi.com/products/datasheet/PGSMAJ%20SERIES_B1805.pdf; ComponentLink2Description: DigiKey Link; ComponentLink2URL: http://digikey.com/product-detail/en/taiwan-semiconductor-corporation/PGSMAJ10A-R3G/PGSMAJ10AR3GCT-ND/8600515; LastUpdated: 9/2/2020 1:20:16 AM; Lifecycle Status: Active; Minimum Order: 1; Mounting Type: Surface Mount; Operating Temperature: -55°C ~ 175°C (TJ); Package / Case: DO-214AC, SMA; Packaging: TapeAndReel; PartId: 5985; Part Status: Active; Price: 0.12; Series: Automotive, AEC-Q101; Supplier 1: DigiKey; Supplier Part Number 1: PGSMAJ10AR3GCT-ND; Supplier Device Package: DO-214AC (SMA)
footprint DO214AC SMA
pins: 1, 2

## PGSMAJ10CA E3G
designator D?
DIODE, TVS, BIDIRECTIONAL; Manufacturer: Taiwan Semiconductor Corporation; Bidirectional Channels: 1; Current - Peak Pulse (10/1000µs): 23.5A; Power Line Protection: No; Power - Peak Pulse: 400W; Type: Zener; Voltage - Breakdown (Min): 11.1V; Voltage - Clamping (Max) @ Ipp: 17V; Voltage - Reverse Standoff (Typ): 10V; Part Number: PGSMAJ10CA E3G; Applications: Automotive; ComponentLink1Description: Datasheet; ComponentLink1URL: https://www.taiwansemi.com/products/datasheet/PGSMAJ%20SERIES_B1805.pdf; ComponentLink2Description: DigiKey Link; ComponentLink2URL: http://digikey.com/product-detail/en/taiwan-semiconductor-corporation/PGSMAJ10CA-E3G/PGSMAJ10CAE3GCT-ND/8600516; LastUpdated: 9/2/2020 1:27:52 AM; Lifecycle Status: Active; Minimum Order: 1; Mounting Type: Surface Mount; Operating Temperature: -55°C ~ 175°C (TJ); Package / Case: DO-214AC, SMA; Packaging: TapeAndReel; PartId: 7504; Part Status: Active; Price: 0.13; Series: Automotive, AEC-Q101; Supplier 1: DigiKey; Supplier Part Number 1: PGSMAJ10CAE3GCT-ND; Supplier Device Package: DO-214AC (SMA)
footprint DO214AC SMA
pins: 1, 2

## PGSMAJ11CA E3G
designator D?
DIODE, TVS, BIDIRECTIONAL; Manufacturer: Taiwan Semiconductor Corporation; Bidirectional Channels: 1; Current - Peak Pulse (10/1000µs): 22A; Power Line Protection: No; Power - Peak Pulse: 400W; Type: Zener; Voltage - Breakdown (Min): 12.2V; Voltage - Clamping (Max) @ Ipp: 18.2V; Voltage - Reverse Standoff (Typ): 11V; Part Number: PGSMAJ11CA E3G; Applications: Automotive; ComponentLink1Description: Datasheet; ComponentLink1URL: https://www.taiwansemi.com/products/datasheet/PGSMAJ%20SERIES_B1805.pdf; ComponentLink2Description: DigiKey Link; ComponentLink2URL: http://digikey.com/product-detail/en/taiwan-semiconductor-corporation/PGSMAJ11CA-E3G/PGSMAJ11CAE3GCT-ND/8600517; LastUpdated: 9/2/2020 1:27:54 AM; Lifecycle Status: Active; Minimum Order: 1; Mounting Type: Surface Mount; Operating Temperature: -55°C ~ 175°C (TJ); Package / Case: DO-214AC, SMA; Packaging: TapeAndReel; PartId: 7669; Part Status: Active; Price: 0.13; Series: Automotive, AEC-Q101; Supplier 1: DigiKey; Supplier Part Number 1: PGSMAJ11CAE3GCT-ND; Supplier Device Package: DO-214AC (SMA)
footprint DO214AC SMA
pins: 1, 2
